# Altium footprint library S61.PcbLib: 50 footprints (part 1 of 4)
Each footprint in its own frame and in the unit in brackets; x right, y up, seen from the top. Pads: shape width x height; smd on the part's side, far side on the other; paste and mask are expansions set on the pad; w line width, h text height; cw(c..) or ccw(c..) is an arc to the next point about the centre after c.
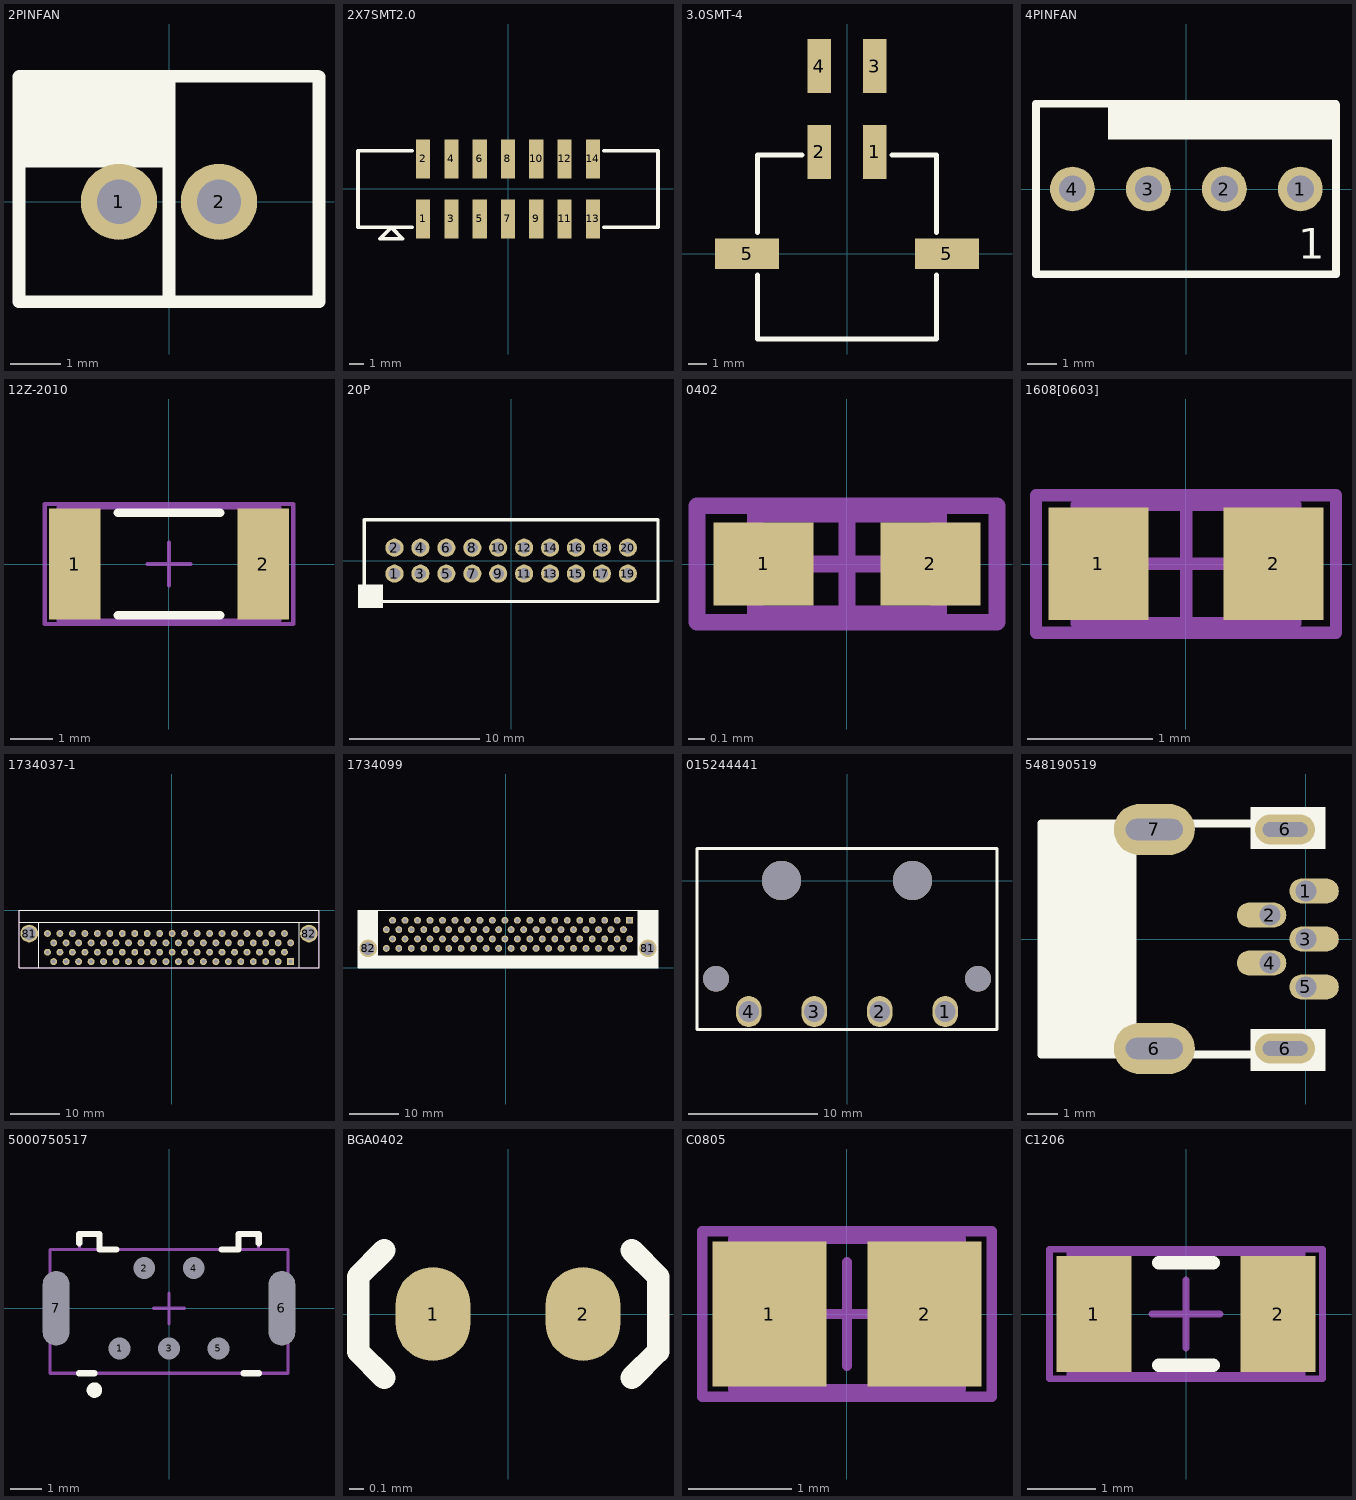
[diagram p0: the footprints below, top view; thin cyan lines are the x and y axes]

## 2PINFAN [mil]
pads (2):
  round 60 hole 35: 1(-39.37,0) 2(39.37,0)
Top Overlay:
  rectangle: -118,27 -1,98
  lines w10: -118.11,98.43 -118.11,-78.74 118.11,-78.74 118.11,98.43 ; -118,99 117,99 ; 0,-77 0,97

## 2X7SMT2.0 [mm]
pads (14):
  rect 1x2.75 smd: 1(-6,-2.125) 2(-6,2.125) 3(-4,-2.125) 4(-4,2.125) 5(-2,-2.125) 6(-2,2.125) 7(0,-2.125) 8(0,2.125) 9(2,-2.125) 10(2,2.125) 11(4,-2.125) 12(4,2.125) 13(6,-2.125) 14(6,2.125)
Top Overlay:
  lines w0.254: -8.23,-2.733 -7.45,-3.513 -9.042,-3.513 -8.23,-2.7 ; -6.756,-2.7 -10.6,-2.7 -10.6,2.7 -6.756,2.7 ; 6.756,-2.7 10.6,-2.7 10.6,2.7 6.756,2.7
3D body: height 6.5, standoff 0, extent -10.6,-2.7 10.6,2.667

## 3.0SMT-4 [mm] "power connector"
pads (6):
  rect 1.27x2.92 smd: 1(1.5,5.48) 2(-1.5,5.48) 3(1.5,10.1) 4(-1.5,10.1)
  rect 3.43x1.65 smd: 5(-5.385,0) 5(5.385,0)
Top Overlay:
  lines w0.254: -4.826,-1.143 -4.825,-4.6 4.825,-4.6 4.826,-1.143 ; -4.826,1.118 -4.825,5.31 -2.412,5.31 ; 2.412,5.31 4.825,5.31 4.826,1.118
3D body: height 7.37, standoff 0, extent -1.702,4.013 -1.295,11.074
3D body: height 7.37, standoff 0, extent 1.27,4.013 1.677,11.075
3D body: height 7.37, standoff 0, extent -4.825,-4.6 4.825,5.31

## 4PINFAN [mm]
pads (4):
  round 1.5 hole 0.9 paste+0.05 mask+0.05: 1(3.81,0) 2(1.27,0) 3(-1.27,0) 4(-3.81,0)
Top Overlay:
  rectangle: -2.616,1.651 4.928,2.794
  lines w0.254: 5,2.85 -5.029,2.85 -5.029,-2.845 -5.024,-2.85 5.004,-2.85 5.004,2.819
  text "1" at 3.734,-2.337 h1.02

## 12Z-2010 [mm] "Chip Resistor, Body 5.0x2.5mm, IPC High Density"
height 0.9
pads (2):
  rect 1.2x2.6 smd: 1(-2.2,0) 2(2.2,0)
Top Overlay:
  lines w0.2: -1.2,-1.2 1.2,-1.2 ; -1.2,1.2 1.2,1.2
Mechanical 13:
  lines w0.1: -2.575,-1.325 2.575,-1.325 2.575,1.325 -2.575,1.325 -2.575,-1.325
Mechanical 15:
  lines w0.1: -0.5,0 0.5,0 ; 0,-0.5 0,0.5 ; -2.9,-1.4 2.9,-1.4 2.9,1.4 -2.9,1.4 -2.9,-1.4
3D body: height 0.9, standoff 0, extent -2.575,-1.325 2.575,1.325

## 20P [mm]
pads (20):
  round 1.4 hole 0.9: 1(-8.997,-1) 2(-8.997,1) 3(-6.997,-1) 4(-6.997,1) 5(-4.997,-1) 6(-4.997,1) 7(-2.997,-1) 8(-2.997,1) 9(-0.997,-1) 10(-0.997,1) 11(1.003,-1) 12(1.003,1) 13(3.003,-1) 14(3.003,1) 15(5.003,-1) 16(5.003,1) 17(7.003,-1) 18(7.003,1) 19(9.003,-1) 20(9.003,1)
Top Overlay:
  rectangle: -11.811,-3.658 -9.881,-1.829
  lines w0.254: -11.328,-3.124 -11.328,3.15 11.328,3.15 11.328,-3.15 -11.322,-3.15

## 0402 [mm] "Chip Capacitor, Body 1.0x0.5mm, IPC High Density"
height 1.3
pads (2):
  rect 0.6x0.5 smd: 1(-0.5,0) 2(0.5,0)
Mechanical 13:
  lines w0.1: -0.55,-0.3 -0.55,0.3 0.55,0.3 0.55,-0.3 -0.55,-0.3
Mechanical 15:
  lines w0.1: -0.3,0 0.3,0 ; 0,-0.3 0,0.3 ; -0.9,-0.35 -0.9,0.35 0.9,0.35 0.9,-0.35 -0.9,-0.35
3D body: height 1.3, standoff 0, extent -0.55,-0.3 0.55,0.3

## 1608[0603] [mm] "Chip Capacitor, Body 1.6x0.8mm, IPC High Density"
height 1.3
pads (2):
  rect 0.8x0.9 smd: 1(-0.7,0) 2(0.7,0)
Mechanical 13:
  lines w0.1: -0.875,-0.475 -0.875,0.475 0.875,0.475 0.875,-0.475 -0.875,-0.475
Mechanical 15:
  lines w0.1: -0.475,0 0.475,0 ; 0,-0.475 0,0.475 ; -1.2,-0.55 -1.2,0.55 1.2,0.55 1.2,-0.55 -1.2,-0.55
3D body: height 1.3, standoff 0, extent -0.875,-0.475 0.875,0.475

## 1734037-1 [mm]
pads (82):
  rect 1.4x1.4 hole 0.8: 1(24.257,-10.5)
  round 1.4 hole 0.8: 2(22.987,-8.595) 3(21.717,-10.5) 4(20.447,-8.595) 5(19.177,-10.5) 6(17.907,-8.595) 7(16.637,-10.5) 8(15.367,-8.595) 9(14.097,-10.5) 10(12.827,-8.595) 11(11.557,-10.5) 12(10.287,-8.595) 13(9.017,-10.5) 14(7.747,-8.595) 15(6.477,-10.5) 16(5.207,-8.595) 17(3.937,-10.5) 18(2.667,-8.595) 19(1.397,-10.5) 20(0.127,-8.595) 21(-1.143,-10.5) 22(-2.413,-8.595) 23(-3.683,-10.5) 24(-4.953,-8.595) 25(-6.223,-10.5) 26(-7.493,-8.595) 27(-8.763,-10.5) 28(-10.033,-8.595) 29(-11.303,-10.5) 30(-12.573,-8.595) 31(-13.843,-10.5) 32(-15.113,-8.595) 33(-16.383,-10.5) 34(-17.653,-8.595) 35(-18.923,-10.5) 36(-20.193,-8.595) 37(-21.463,-10.5) 38(-22.733,-8.595) 39(-24.003,-10.5) 40(-25.273,-8.595) 41(24.257,-6.69) 42(22.987,-4.785) 43(21.717,-6.69) 44(20.447,-4.785) 45(19.177,-6.69) 46(17.907,-4.785) 47(16.637,-6.69) 48(15.367,-4.785) 49(14.097,-6.69) 50(12.827,-4.785) 51(11.557,-6.69) 52(10.287,-4.785) 53(9.017,-6.69) 54(7.747,-4.785) 55(6.477,-6.69) 56(5.207,-4.785) 57(3.937,-6.69) 58(2.667,-4.785) 59(1.397,-6.69) 60(0.127,-4.785) 61(-1.143,-6.69) 62(-2.413,-4.785) 63(-3.683,-6.69) 64(-4.953,-4.785) 65(-6.223,-6.69) 66(-7.493,-4.785) 67(-8.763,-6.69) 68(-10.033,-4.785) 69(-11.303,-6.69) 70(-12.573,-4.785) 71(-13.843,-6.69) 72(-15.113,-4.785) 73(-16.383,-6.69) 74(-17.653,-4.785) 75(-18.923,-6.69) 76(-20.193,-4.785) 77(-21.463,-6.69) 78(-22.733,-4.785) 79(-24.003,-6.69) 80(-25.273,-4.785)
  round 3.6 hole 2.6: 81(-28.981,-4.785) 82(27.965,-4.785)
Top Overlay:
  lines w0.2: -31.039,-2.5 30.023,-2.5 ; -27.028,-11.8 -27.028,-2.58 ; 26.012,-11.8 26.012,-2.5 ; -31.039,-11.8 -31.039,0 30.023,0 30.023,-11.8 -31.039,-11.8
Mechanical 13:
  lines w0.1: -31.064,-2.5 30.023,-2.5 ; -31.039,0 29.972,0 ; -31.039,0 29.972,0 ; -31.039,0 -31.039,-11.8 29.972,-11.8 29.972,0

## 1734099 [mm]
pads (82):
  rect 1.4x1.4 hole 0.8: 1(25.273,9.655)
  round 1.4 hole 0.8: 2(24.003,7.75) 3(22.733,9.655) 4(21.463,7.75) 5(20.193,9.655) 6(18.923,7.75) 7(17.653,9.655) 8(16.383,7.75) 9(15.113,9.655) 10(13.843,7.75) 11(12.573,9.655) 12(11.303,7.75) 13(10.033,9.655) 14(8.763,7.75) 15(7.493,9.655) 16(6.223,7.75) 17(4.953,9.655) 18(3.683,7.75) 19(2.413,9.655) 20(1.143,7.75) 21(-0.127,9.655) 22(-1.397,7.75) 23(-2.667,9.655) 24(-3.937,7.75) 25(-5.207,9.655) 26(-6.477,7.75) 27(-7.747,9.655) 28(-9.017,7.75) 29(-10.287,9.655) 30(-11.557,7.75) 31(-12.827,9.655) 32(-14.097,7.75) 33(-15.367,9.655) 34(-16.637,7.75) 35(-17.907,9.655) 36(-19.177,7.75) 37(-20.447,9.655) 38(-21.717,7.75) 39(-22.987,9.655) 40(-24.257,7.75) 41(25.273,5.845) 42(24.003,3.94) 43(22.733,5.845) 44(21.463,3.94) 45(20.193,5.845) 46(18.923,3.94) 47(17.653,5.845) 48(16.383,3.94) 49(15.113,5.845) 50(13.843,3.94) 51(12.573,5.845) 52(11.303,3.94) 53(10.033,5.845) 54(8.763,3.94) 55(7.493,5.845) 56(6.223,3.94) 57(4.953,5.845) 58(3.683,3.94) 59(2.413,5.845) 60(1.143,3.94) 61(-0.127,5.845) 62(-1.397,3.94) 63(-2.667,5.845) 64(-3.937,3.94) 65(-5.207,5.845) 66(-6.477,3.94) 67(-7.747,5.845) 68(-9.017,3.94) 69(-10.287,5.845) 70(-11.557,3.94) 71(-12.827,5.845) 72(-14.097,3.94) 73(-15.367,5.845) 74(-16.637,3.94) 75(-17.907,5.845) 76(-19.177,3.94) 77(-20.447,5.845) 78(-21.717,3.94) 79(-22.987,5.845) 80(-24.257,3.94)
  round 3.6 hole 2.6: 81(28.981,3.94) 82(-27.965,3.94)
Top Overlay:
  rectangle: -30.023,2.21 -26.086,11.684
  rectangle: 27.051,2.007 30.937,11.684
  rectangle: -29.947,0.051 30.988,2.311
  lines w0.2: -30.023,2.398 31.039,2.398 ; -26.012,2.398 -26.012,11.698 ; 27.028,2.478 27.028,11.698 ; -30.023,0 31.039,0 31.039,11.698 -30.023,11.698 -30.023,0

## 015244441 [mm]
pads (4):
  oval 2x2.4 hole 1.6 paste+0.05 mask+0.05: 1(7.62,-10.16) 2(2.54,-10.16) 3(-2.54,-10.16) 4(-7.62,-10.16)
via -10.16,-7.62 diameter 2 hole 2
via 10.16,-7.62 diameter 2 hole 2
via -5.08,0 diameter 3 hole 3
via 5.08,0 diameter 3 hole 3
Top Overlay:
  lines w0.254: -11.63,2.438 -11.63,-11.557 11.63,-11.557 11.63,2.438 ; -11.63,2.489 11.63,2.489

## 548190519 [mm]
pads (9):
  oval 1.65x0.838 / inner oval 1.65x1.1 / far side oval 1.65x1.1 hole 0.7 copper offset 0.275,0 paste+0.05 mask+0.05: 1(0,1.6) 3(0,0) 5(0,-1.6)
  oval 1.65x0.838 / inner oval 1.65x1.1 / far side oval 1.65x1.1 hole 0.7 copper offset -0.275,0 paste+0.05 mask+0.05: 2(-1.2,0.8) 4(-1.2,-0.8)
  oval 2.7x1.7 hole 0.7 slot 1.9 at 0 deg paste+0.05 mask+0.05: 6(-5.05,-3.65) 7(-5.05,3.65)
  oval 2x1 hole 0.5 slot 1.5 at 0 deg paste+0.05 mask+0.05: 6(-0.69,-3.65) 6(-0.69,3.65)
Top Overlay:
  rectangle: -1.85,3 0.65,4.4
  rectangle: -1.85,-4.4 0.65,-3
  rectangle: -8.763,-3.734 -5.65,3.734
  lines w0.254: -1.85,-3.85 -8.814,-3.85 -8.814,3.85 -1.85,3.85

## 5000750517 [mm] "Connector; USB Mini-B, Type 2, Thru-Hole; 5 Position; Vertical"
height 7.7
pads (7):
  round 0.4 / inner round 0.4 / far side oval 1.1x1.7 hole 0.7: 1(-1.6,-1.3) 2(-0.8,1.3) 3(0,-1.3) 4(0.8,1.3) 5(1.6,-1.3)
  oval 0.55x2.1 / inner oval 0.55x2.1 / far side oval 1.6x3.9 hole 0.85 slot 2.4 at 90 deg: 6(3.65,0) 7(-3.65,0)
Top Overlay:
  circle w0.25: c-2.41,-2.645 r0.125
  lines w0.2: -2.91,-2.1 -2.41,-2.1 ; -2.9,2.1 -2.9,2.4 -2.25,2.4 -2.25,1.9 -1.7,1.9 ; 1.7,1.9 2.25,1.9 2.25,2.4 2.9,2.4 2.9,2.1 ; 2.41,-2.1 2.91,-2.1
Mechanical 13:
  lines w0.1: -2.9,1.9 -2.9,2.4 -2.25,2.4 -2.25,1.9 ; 2.25,1.9 2.25,2.4 2.9,2.4 2.9,1.9 ; -3.85,-2.1 -3.85,1.9 3.85,1.9 3.85,-2.1 -3.85,-2.1
Mechanical 15:
  lines w0.1: -0.5,0 0.5,0 ; 0,-0.5 0,0.5
3D body: height 7.7, standoff 0, extent -3.849,-2.099 3.849,1.899
3D body: height 7.7, standoff 0, extent -2.899,1.901 -2.251,2.399
3D body: height 7.7, standoff 0, extent 2.251,1.901 2.899,2.399

## BGA0402 [mil]
pads (2):
  rrect100% 20x25 smd: 1(-20,0) 2(20,0)
Top Overlay:
  lines w6: -33,-17 -40,-10 -40,10 -33,17 ; 33,-17 40,-10 40,10 33,17

## C0805 [mm] "Chip Capacitor, Body 2.0x1.3mm, IPC High Density"
height 1.4
pads (2):
  rect 1.1x1.4 smd: 1(-0.75,0) 2(0.75,0)
Mechanical 13:
  lines w0.1: -1.1,-0.725 -1.1,0.725 1.1,0.725 1.1,-0.725 -1.1,-0.725
Mechanical 15:
  lines w0.1: -0.5,0 0.5,0 ; 0,-0.5 0,0.5 ; -1.4,-0.8 -1.4,0.8 1.4,0.8 1.4,-0.8 -1.4,-0.8
3D body: height 1.4, standoff 0, extent -1.1,-0.725 1.1,0.725

## C1206 [mm] "Chip Capacitor, Body 3.2x1.6mm, IPC High Density"
height 1.3
pads (2):
  rect 1.1x1.7 smd: 1(-1.35,0) 2(1.35,0)
Top Overlay:
  lines w0.2: -0.4,-0.75 0.4,-0.75 ; -0.4,0.75 0.4,0.75
Mechanical 13:
  lines w0.1: -1.7,-0.9 -1.7,0.9 1.7,0.9 1.7,-0.9 -1.7,-0.9
Mechanical 15:
  lines w0.1: -0.5,0 0.5,0 ; 0,-0.5 0,0.5 ; -2,-0.95 -2,0.95 2,0.95 2,-0.95 -2,-0.95
3D body: height 1.3, standoff 0, extent -1.7,-0.9 1.7,0.9